# Altium footprint library My Library.PcbLib: 872 footprints (part 48 of 55)
Each footprint in its own frame and in the unit in brackets; x right, y up, seen from the top. Pads: shape width x height; smd on the part's side, far side on the other; paste and mask are expansions set on the pad; w line width, h text height; cw(c..) or ccw(c..) is an arc to the next point about the centre after c.
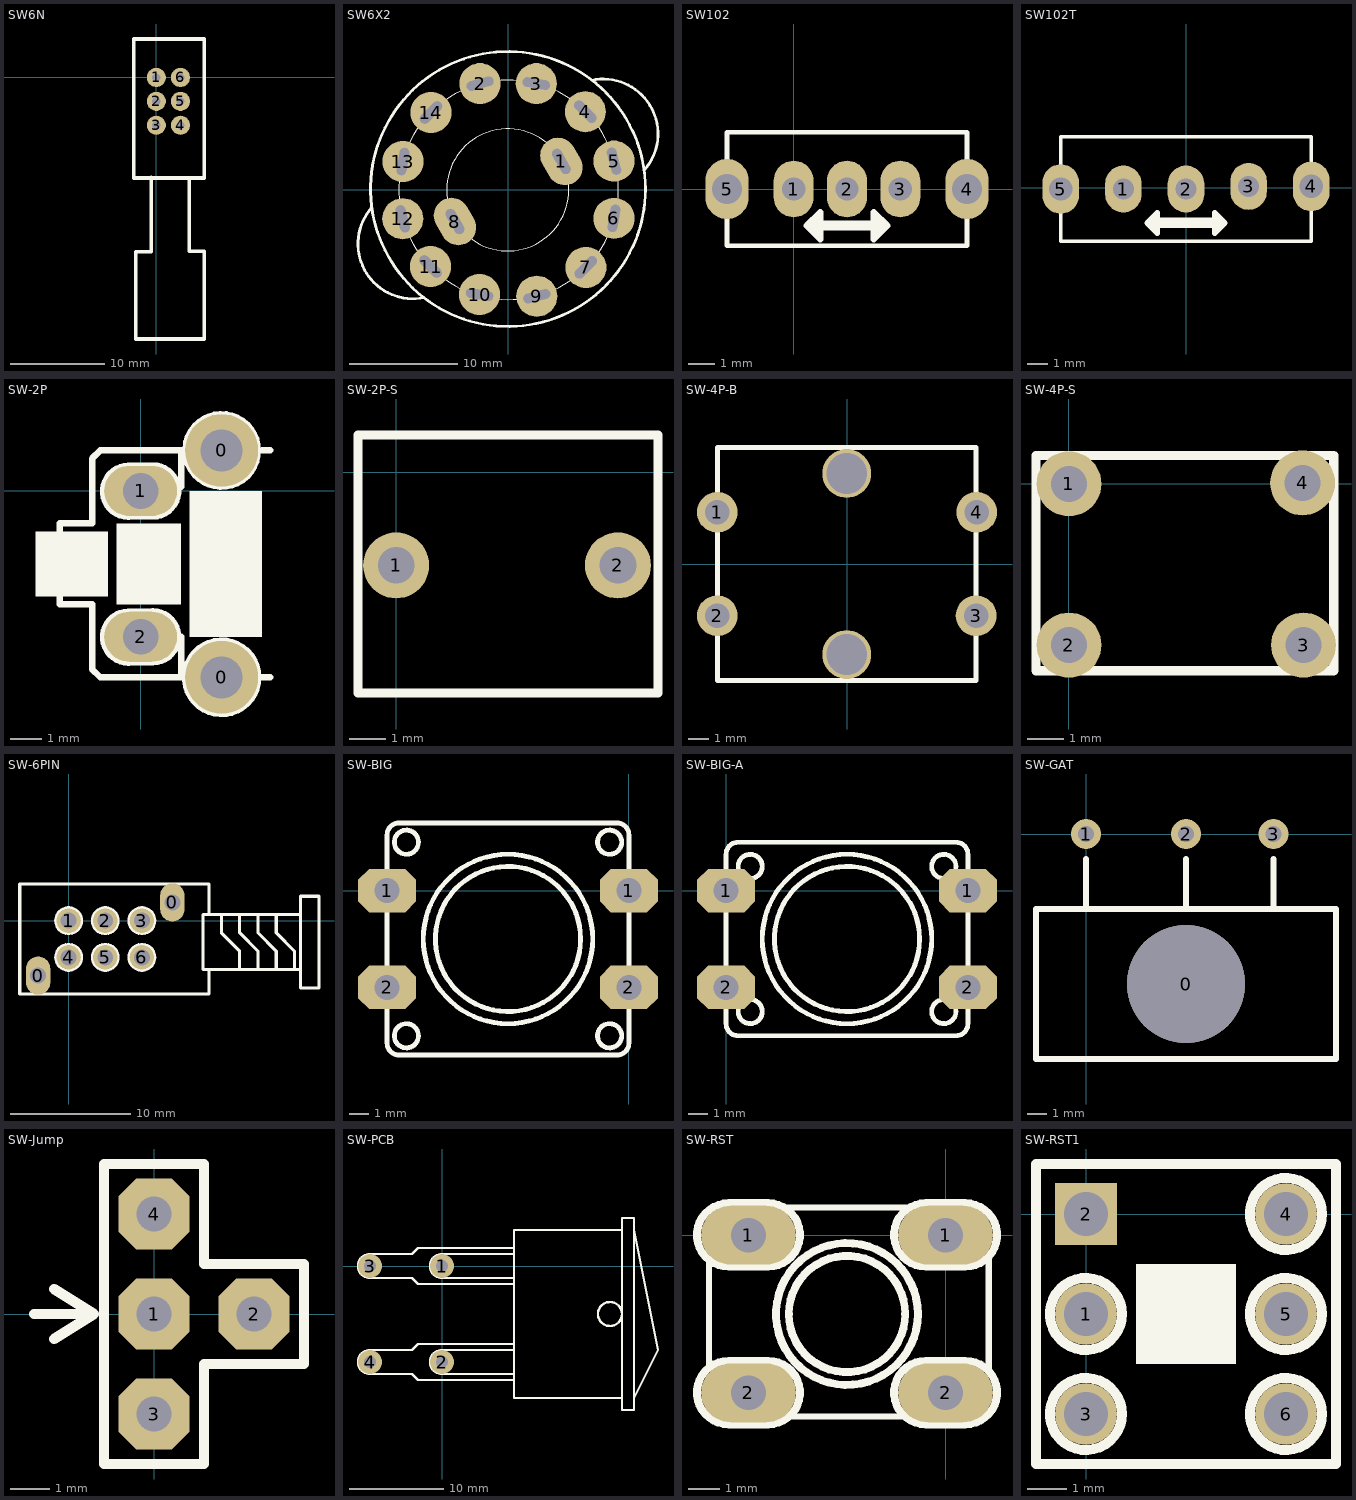
[diagram p47: the footprints below, top view; thin cyan lines are the x and y axes]

## SW6N [mil]
pads (6):
  round 80 hole 35: 1(0,0) 2(0,-100) 3(0,-200) 4(101,-200) 5(101,-100) 6(101,0)
Top Overlay:
  lines w15: -21,-419 -21,-730 -87,-730 -87,-1095 201,-1095 201,-728 137,-728 137,-421 142,-421 ; -95,-421 -95,161 200,161 200,-421 -95,-421
3D body "User Library-DPDT Push Switch-1.STEP": height 394.31, standoff -156.88, extent -95,-1096.66 200.28,161.56

## SW6X2 [mil] "Switch 6x2"
height 500
pads (14):
  oval 180x130 hole 35 slot 100 at 120 deg rot 120: 1(193,104) 8(-195,-115)
  round 150 hole 35 slot 100 at 15 deg: 2(-103.48,387.48) 9(103.48,-387.48)
  round 150 hole 35 slot 100 at 170 deg: 3(101.54,387.46) 10(-105.2,-381.27)
  round 150 hole 35 slot 100 at 135 deg: 4(280.32,285.24) 11(-283.98,-279.05)
  round 150 hole 35 slot 100 at 105 deg: 5(385,105) 12(-385,-105)
  round 150 hole 35 slot 100 at 80 deg: 6(384.48,-103.48) 13(-384.48,103.48)
  round 150 hole 35 slot 100 at 45 deg: 7(282.26,-282.26) 14(-282.26,282.26)
Top Overlay:
  circle w10: c-1.46,3.46 r501
  circle w1: c0.54,0.46 r400
  circle w1: c-2.46,0.46 r222.5
  lines w10: -498,-63.94 ccw(c-348.29,-196.56) -307.65,-392.38 ; 303.52,399.93 cw(c345.18,204.32) 495.11,71.95

## SW102 [mil] "Switch 102 On Board nho"
height 2
pads (5):
  oval 60x85 hole 35: 1(0,0) 2(80,0) 3(160,0)
  oval 65x90 hole 45: 4(260,0) 5(-100,0)
Top Overlay:
  lines w7: -100,-45 -100,-85 260,-85 260,-45 ; -100,45 -100,85 260,85 260,45
  lines w10: 20,-55 40,-35 40,-75 20,-55 ; 120,-75 120,-35 140,-55 120,-75
  lines w15: 30,-55 130,-55

## SW102T [mil] "Switch 102 On Board To"
height 2
pads (5):
  oval 70x90 hole 40: 1(-120,-2.5) 2(0,-2.5) 3(120,2.5)
  oval 70x95 hole 45: 4(240,2.5) 5(-240,-2.5)
Top Overlay:
  lines w7: -240,-50 -240,-102.5 240,-102.5 240,-45 ; -240,45 -240,97.5 240,97.5 240,45
  lines w10: -75,-67.5 -55,-47.5 -55,-87.5 -75,-67.5 ; 55,-87.5 55,-47.5 75,-67.5 55,-87.5
  lines w20: -65,-67.5 65,-67.5

## SW-2P [mil]
pads (4):
  round 90 hole 52: 0(100,-230) 0(100,50)
  oval 90x62 hole 44: 1(0,0) 2(0,-180)
Top Overlay:
  circle w8: c100,50 r44.72
  circle w8: c100,-230 r45.28
  region: -130,-50 -130,-130 -40,-130 -40,-50
  region: -30,-40 -30,-140 50,-140 50,-40
  region: 60,0 60,-180 150,-180 150,0
  lines w8: 50,-180 50,-230 40,-230 -50,-230 -60,-220 -60,-140 -100,-140 -100,-40 -60,-40 -60,40 -50,50 40,50 50,50 50,5 ; 150,-230 160,-230 ; 150,50 160,50
  lines w10: -15,-210.83 cw(c-15,-180.41) -15,-150 14.59,-150 ; -15,-30.83 cw(c-15,-0.41) -15,30 14.59,30 ; -14.59,-210.41 15,-210.41 ccw(c15,-180) 15,-149.59 ; -14.59,-30.41 15,-30.41 ccw(c15,0) 15,30.41

## SW-2P-S [mm]
height 5.59
pads (2):
  round 1.8 hole 1: 1(0,-2.54) 2(6.045,-2.54)
Top Overlay:
  lines w0.254: -1.041,-6.02 -1.041,1.016 7.137,1.016 7.137,-6.02 -1.041,-6.02

## SW-4P-B [mm] "Nut bam lon"
pads (6):
  round 2 hole 1.2: 1(-6.375,2.54) 2(-6.375,-2.54) 3(6.325,-2.54) 4(6.35,2.54)
  round 2.4 hole 2: ""(-0.025,-4.445) ""(-0.025,4.445)
Top Overlay:
  lines w0.254: -6.375,-5.715 -6.375,5.715 6.325,5.715 6.325,-5.715 -6.375,-5.715
3D body "User Library-Button-BIG-4.step": height 9.5, standoff -3.5, extent -6.936,-6 6.937,6

## SW-4P-S [mm]
height 5.59
pads (4):
  round 1.8 hole 1: 1(0,0) 2(0,-4.47) 3(6.502,-4.47) 4(6.477,0.025)
Top Overlay:
  lines w0.254: -0.914,-5.182 -0.914,0.787 6.934,0.787 7.341,0.787 7.341,-5.182 -0.914,-5.182
3D body "User Library-Button-small-4pin.step": height 9.52, standoff -3.48, extent -0.864,-5.235 7.348,0.765

## SW-6PIN [mil]
pads (8):
  oval 80x125 hole 52: 0(-100,-180) 0(340,60)
  round 80 hole 52: 1(0,0) 2(120,0) 3(240,0) 4(0,-120) 5(120,-120) 6(240,-120)
Top Overlay:
  circle w10: c0,-120 r42.43
  circle w10: c120,-120 r42.43
  circle w10: c240,-120 r42.43
  circle w10: c240,0 r42.43
  circle w10: c120,0 r42.43
  circle w10: c0,0 r42.43
  lines w10: 500,20 500,-40 560,-100 560,-160 ; 560,20 560,-40 620,-100 620,-160 ; 620,20 620,-40 680,-100 680,-160 ; 680,20 680,-40 740,-100 740,-160 ; 460,-160 440,-160 440,20 460,20 ; 460,-160 460,-240 -160,-240 -160,100 -160,120 460,120 460,20 ; 460,-160 760,-160 ; 460,20 760,20 ; 760,-160 760,-220 820,-220 820,80 760,80 760,20 ; 760,-160 760,20

## SW-BIG [mil]
pads (4):
  oct 120x90 hole 52: 1(-500,0) 1(0,0) 2(-500,-200) 2(0,-200)
Top Overlay:
  circle w10: c-460,100 r25
  circle w10: c-40,100 r25
  circle w10: c-40,-300 r25
  circle w10: c-460,-300 r25
  circle w10: c-250,-100 r175
  circle w10: c-250,-100 r150
  lines w10: -500,-250 -500,-275 ; -450,-340 -475,-340 ; -450,140 -475,140 ; -50,-340 -25,-340 ; -50,140 -25,140 ; 0,-250 0,-275 ; -500,-275 -500,75 -500,90 -500,115 cw(c-475,115) -475,140 ; -500,-275 -500,-315 ccw(c-475,-315) -475,-340 ; -475,-340 -25,-340 ; -475,140 -25,140 ; -25,-340 ccw(c-25,-315) 0,-315 0,-275 ; -25,140 cw(c-25,115) 0,115 0,90 0,75 0,-275
3D body "User Library-SWT9-1.STEP": height 288, standoff -137.19, extent -506.91,-338 4.91,134.44

## SW-BIG-A [mil]
pads (4):
  oct 120x90 hole 52: 1(0,0) 1(500,0) 2(0,-200) 2(500,-200)
Top Overlay:
  circle w10: c50,50 r25
  circle w10: c450,50 r25
  circle w10: c450,-250 r25
  circle w10: c50,-250 r25
  circle w10: c250,-100 r175
  circle w10: c250,-100 r150
  lines w10: 0,-250 0,-275 ; 0,50 0,75 ; 50,-300 25,-300 ; 50,100 25,100 ; 450,-300 475,-300 ; 450,100 475,100 ; 500,-250 500,-275 ; 500,50 500,75 ; 0,-275 ccw(c25,-275) 25,-300 ; 0,-275 0,75 ; 0,75 cw(c25,75) 25,100 ; 25,-300 475,-300 ; 25,100 475,100 ; 475,-300 ccw(c475,-275) 500,-275 ; 475,100 cw(c475,75) 500,75 ; 500,-275 500,75

## SW-GAT [mm]
pads (4):
  round 6 hole 6: 0(5.08,-7.62)
  round 1.524 hole 0.8: 1(0,0) 2(5.08,0) 3(9.525,0)
Top Overlay:
  lines w0.305: 0,-3.81 0,-1.27 ; 5.08,-3.81 5.08,-1.27 ; 9.525,-3.81 9.525,-1.27 ; -2.54,-11.43 -2.54,-3.81 12.7,-3.81 12.7,-11.43 -2.54,-11.43

## SW-Jump [mm]
pads (4):
  oct 1.8x1.8 hole 0.9: 1(0,0) 2(2.54,0) 3(0,-2.54) 4(0,2.54)
Top Overlay:
  lines w0.254: -3.048,0 -1.524,0 ; -2.54,-0.635 -1.524,0 ; -2.54,0.635 -1.524,0 ; -1.27,-3.81 1.27,-3.81 1.27,-1.27 3.81,-1.27 3.81,1.27 1.27,1.27 1.27,3.81 -1.27,3.81 -1.27,-1.27 -1.27,1.27 -1.27,-3.81

## SW-PCB [mm]
pads (4):
  round 2.54 hole 1.27: 1(0,0) 2(0,-10.16) 3(-7.62,0) 4(-7.62,-10.16)
Top Overlay:
  circle w0.254: c17.78,-5.08 r1.27
  lines w0.254: 7.62,-12.065 -2.54,-12.065 -3.175,-11.43 -7.62,-11.43 cw(c-7.62,-10.16) -7.62,-8.89 -3.175,-8.89 -2.54,-8.255 7.62,-8.255 ; 7.62,-11.43 0,-11.43 cw(c0,-10.16) 0,-8.89 7.62,-8.89 ; 7.62,-1.905 -2.54,-1.905 -3.175,-1.27 -7.62,-1.27 cw(c-7.62,0) -7.62,1.27 -3.175,1.27 -2.54,1.905 7.62,1.905 ; 7.62,-1.27 0,-1.27 cw(c0,0) 0,1.27 7.62,1.27 ; 19.05,-13.97 7.62,-13.97 7.62,3.81 19.05,3.81 ; 20.32,-13.97 22.86,-8.89 20.32,3.81 ; 19.05,-15.24 19.05,5.08 20.32,5.08 20.32,-15.24 19.05,-15.24

## SW-RST [mil]
pads (4):
  oval 120x75 hole 44: 1(-250,0) 1(0,0) 2(-250,-200) 2(0,-200)
Top Overlay:
  circle w10: c-125,-100 r90
  circle w10: c-35,-180 r11.18
  circle w10: c-40,-20 r10
  circle w10: c-210,-20 r11.18
  circle w10: c-210,-180 r11.18
  circle w10: c-125,-100 r73.82
  lines w8: -300,-165 -300,-35 ; -200,35 -45,35 ; -195,-230 -50,-230 ; 55,-170 55,-30
  lines w10: -275,-240 cw(c-275,-199.69) -275,-159.38 -225,-159.38 cw(c-225,-199.69) -225,-240 -275,-240 ; -275,-40 cw(c-275,0.31) -275,40.62 -225,40.62 cw(c-225,0.31) -225,-40 -275,-40 ; -25,-240 cw(c-25,-199.69) -25,-159.38 25,-159.38 cw(c25,-199.69) 25,-240 -25,-240 ; -25,-40 cw(c-25,0.31) -25,40.62 25,40.62 cw(c25,0.31) 25,-40 -25,-40
3D body "SW3dPS-.STEP": height 275.59, standoff -137.8, extent -277.51,-220.04 33.52,24.05

## SW-RST1 [mil]
pads (6):
  round 62 hole 44: 1(0,-100) 3(0,-200) 4(200,0) 5(200,-100) 6(200,-200)
  rect 62x62 hole 44: 2(0,0)
Top Overlay:
  circle w10: c200,0 r36.06
  circle w10: c200,-100 r36.06
  circle w10: c200,-200 r36.06
  circle w10: c0,-200 r36.06
  circle w10: c0,-100 r36.06
  rectangle: 50,-150 150,-50
  lines w10: -50,-250 -50,50 250,50 250,-250 -50,-250